# Altium footprint library 封装库.PcbLib: 755 footprints (part 3 of 48)
Each footprint in its own frame and in the unit in brackets; x right, y up, seen from the top. Pads: shape width x height; smd on the part's side, far side on the other; paste and mask are expansions set on the pad; w line width, h text height; cw(c..) or ccw(c..) is an arc to the next point about the centre after c.
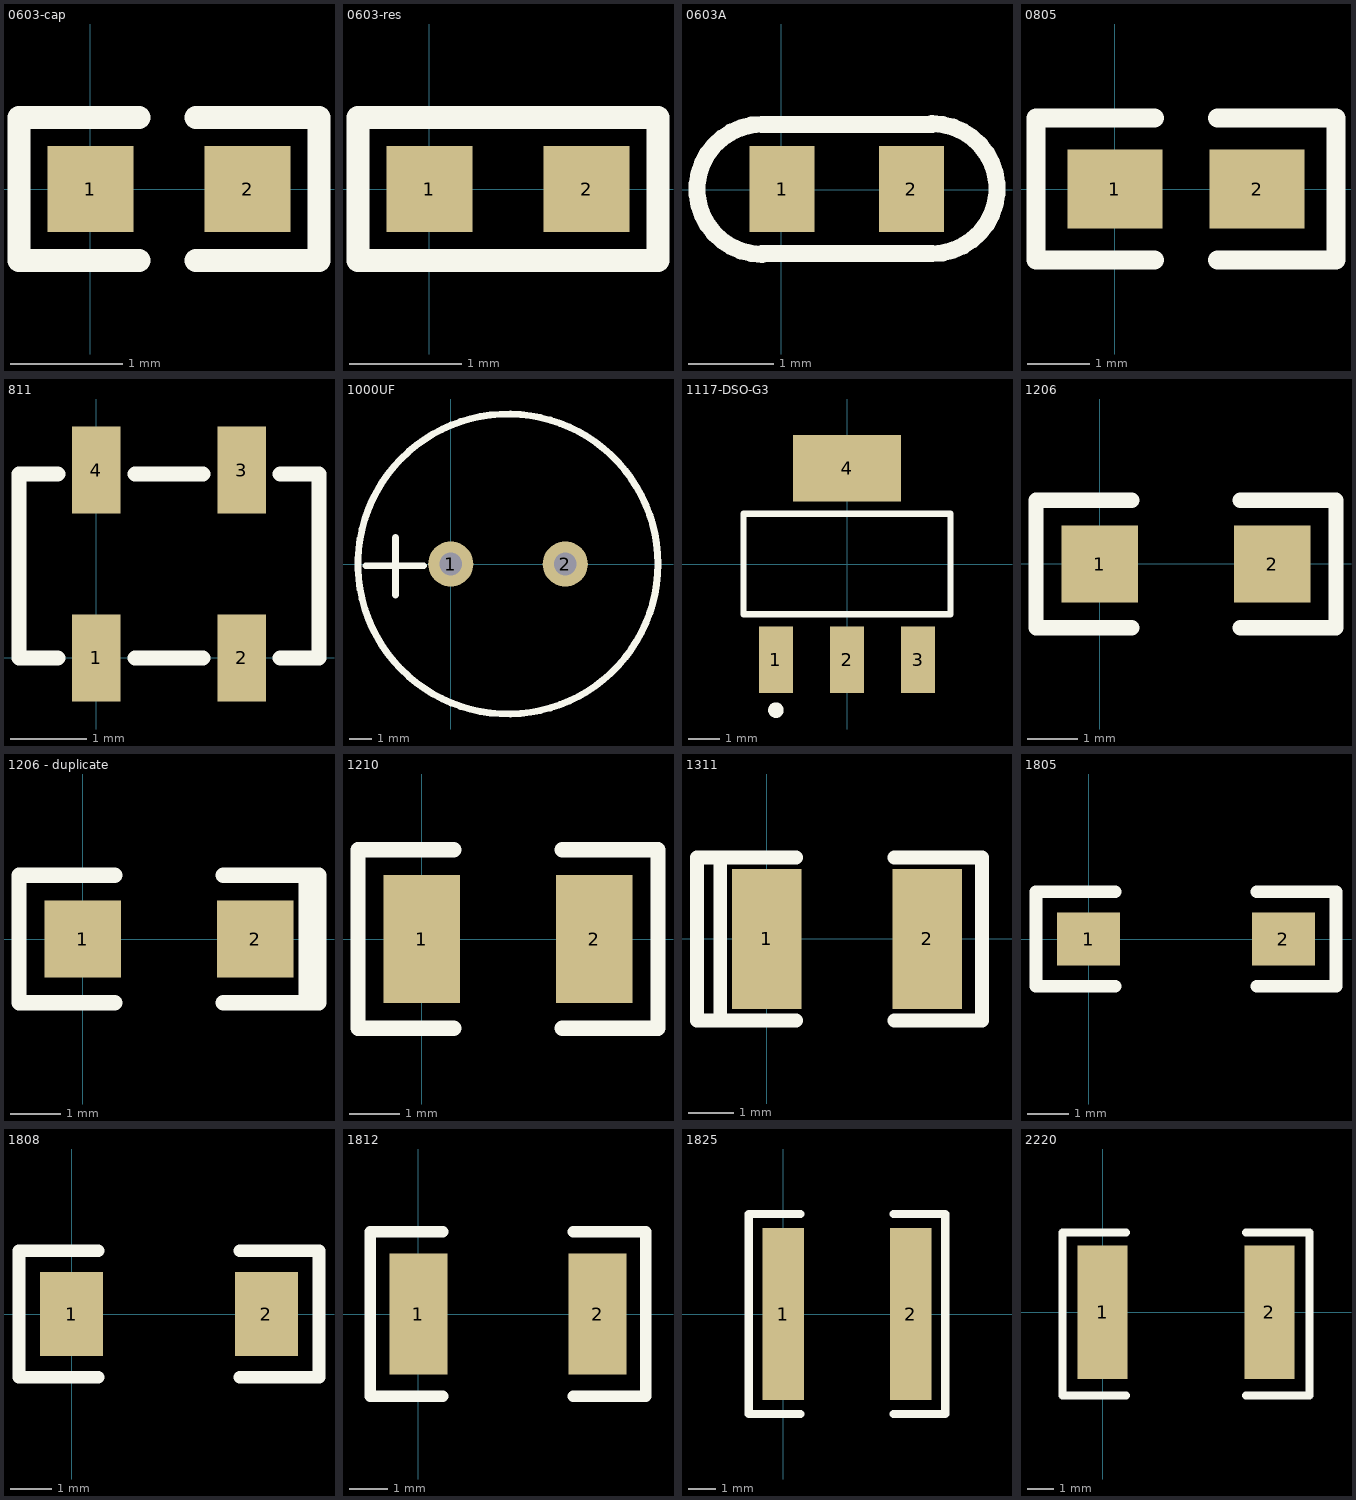
[diagram p2: the footprints below, top view; thin cyan lines are the x and y axes]

## 0603-cap [mil]
pads (2):
  rect 30x30 smd: 1(0,0) 2(55,0)
Top Overlay:
  lines w8: 17,-25 -25,-25 -25,25 17,25 ; 37,-25 79,-25 ; 37,25 79,25 ; 80,-25 80,25

## 0603-res [mil]
pads (2):
  rect 30x30 smd: 1(0,0) 2(55,0)
Top Overlay:
  lines w8: -25,-25 -25,25 80,25 80,-25 -25,-25

## 0603A [mil]
pads (2):
  rect 30x40 smd: 1(0.31,0.44) 2(60.31,0.44)
Top Overlay:
  lines w7.87: -8.94,-29.84 cw(c-8.94,0.3) -8.94,30.44 69.8,30.44 ; -8.94,-29.56 69.8,-29.56 ccw(c69.8,0.58) 69.8,30.72

## 0805 [mil]
pads (2):
  rect 60x50 smd: 1(0,0) 2(90,0)
Top Overlay:
  lines w12: 25,-45 -50,-45 -50,45 25,45 ; 65,-45 140,-45 140,45 65,45

## 811 [mil]
pads (4):
  rect 25x45 smd: 1(0,0) 2(75,0) 3(75,97) 4(0,97)
Top Overlay:
  lines w7.87: -20,0 -40,0 -40,90 -40,95 -35,95 -20,95 ; 20,0 55,0 ; 20,95 55,95 ; 95,0 115,0 115,95 95,95

## 1000UF [mm]
pads (2):
  round 2 hole 1: 1(0,0) 2(5.08,0)
Top Overlay:
  circle w0.305: c2.54,0 r6.65
  lines w0.305: -3.747,-0.076 -1.207,-0.076 ; -2.447,-1.371 -2.447,1.169

## 1117-DSO-G3 [mm] "1117"
pads (4):
  rect 1.1x2.15 smd: 1(-2.3,-3.1) 2(0,-3.1) 3(2.3,-3.1)
  rect 3.5x2.15 smd: 4(0,3.1)
Top Overlay:
  circle w0.25: c-2.3,-4.725 r0.125
  lines w0.2: -3.35,-1.625 3.35,-1.625 3.35,1.625 -3.35,1.625 -3.35,-1.625

## 1206 [mil]
pads (2):
  rect 60x60 smd: 1(-0.06,-0.16) 2(134.94,-0.16)
Top Overlay:
  lines w12: 24.94,-50.16 -50.06,-50.16 -50.06,49.84 24.94,49.84 ; 109.94,-50.16 184.94,-50.16 184.94,49.84 109.94,49.84

## 1206 - duplicate [mil]
pads (2):
  rect 60x60 smd: 1(0,0) 2(135,0)
Top Overlay:
  lines w12: 25,-50 -50,-50 -50,50 25,50 ; 110,-50 185,-50 185,50 110,50 ; 175,-50 175,50

## 1210 [mil]
pads (2):
  rect 60x100 smd: 1(0,0) 2(135,0)
Top Overlay:
  lines w12: 25,-70 -50,-70 -50,70 25,70 ; 110,-70 185,-70 185,70 110,70

## 1311 [mil]
pads (2):
  rect 60x120 smd: 1(0,0) 2(138,0)
Top Overlay:
  lines w11.81: -60,-70 -60,70 ; -40,-70 -40,70
  lines w12: -60,-70 25,-70 ; -60,70 25,70 ; 110,-70 185,-70 185,70 110,70

## 1805 [mil]
pads (2):
  rect 60x50 smd: 1(0,0) 2(185,0)
Top Overlay:
  lines w12: 25,-45 -50,-45 -50,45 25,45 ; 160,-45 235,-45 235,45 160,45

## 1808 [mil]
pads (2):
  rect 60x80 smd: 1(0,0) 2(185,0)
Top Overlay:
  lines w12: 25,-60 -50,-60 -50,60 25,60 ; 160,-60 235,-60 235,60 160,60

## 1812 [mil]
pads (2):
  rect 60x125 smd: 1(0,0) 2(185,0)
Top Overlay:
  lines w12: 25,-85 -50,-85 -50,85 25,85 ; 160,-85 235,-85 235,85 160,85

## 1825 [mil]
pads (2):
  rect 60x250 smd: 1(0,0) 2(185,0)
Top Overlay:
  lines w12: 25,-145 -50,-145 -50,145 25,145 ; 160,-145 235,-145 235,145 160,145

## 2220 [mm]
pads (2):
  rect 1.905x5.08 smd: 1(0,0) 2(6.35,0)
Top Overlay:
  lines w0.305: 0.889,-3.175 -1.524,-3.175 -1.524,3.048 0.889,3.048 ; 5.461,-3.175 7.874,-3.175 7.874,3.048 5.461,3.048